# Altium footprint library goldpin_pcb.PcbLib: 235 footprints (part 3 of 15)
Each footprint in its own frame and in the unit in brackets; x right, y up, seen from the top. Pads: shape width x height; smd on the part's side, far side on the other; paste and mask are expansions set on the pad; w line width, h text height; cw(c..) or ccw(c..) is an arc to the next point about the centre after c.
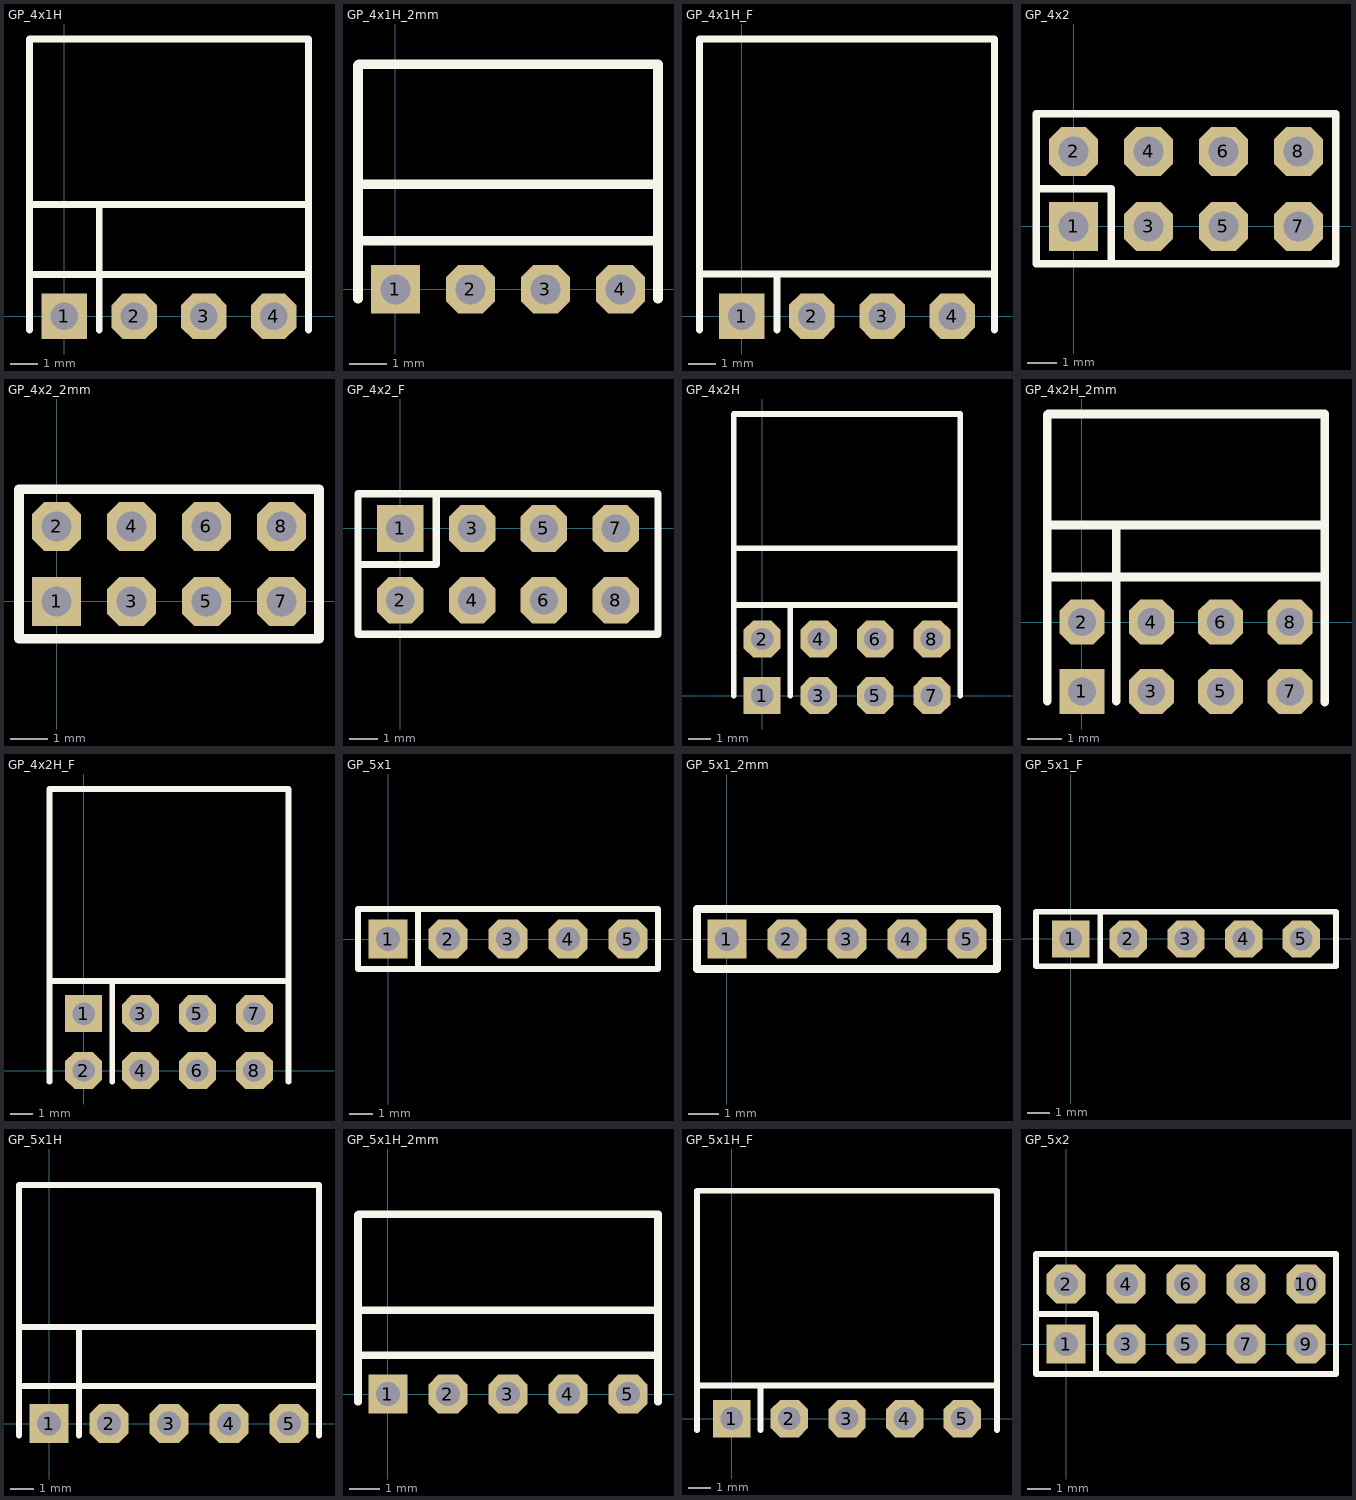
[diagram p2: the footprints below, top view; thin cyan lines are the x and y axes]

## GP_4x1H [mil]
pads (4):
  rect 65x65 hole 39.37: 1(0,0)
  oct 65x65 hole 39.37: 2(100,0) 3(200,0) 4(300,0)
Top Overlay:
  lines w10: -50,-19.68 -50,80.31 -50,397.64 350,397.64 350,80.31 350,-19.68 ; -50,60 350,60 350,71.26 ; -50,160.51 350,160.51 ; 50,-19.68 50,80.31 50,160
3D body: height 120.87, standoff -89.13, extent -50,-12.5 350,390

## GP_4x1H_2mm [mm]
height 4.45
pads (4):
  rect 1.3x1.3 hole 0.8: 1(0,0)
  oct 1.3x1.3 hole 0.8: 2(2,0) 3(4,0) 4(6,0)
Top Overlay:
  lines w0.254: -1,-0.25 -1,1.822 -1,5.973 ; -1,1.3 7,1.3 ; -1,2.8 7,2.8
  lines w0.256: -1,5.973 -0.973,6 7,6 7,-0.25
3D body: height 1.99, standoff -3.04, extent -1,-0.25 7,5.973

## GP_4x1H_F [mil]
pads (4):
  rect 65x65 hole 39.37: 1(0,0)
  oct 65x65 hole 39.37: 2(100,0) 3(200,0) 4(300,0)
Top Overlay:
  lines w10: -60,-20 -60,395 360,395 360,-20 ; -55,60 360,60 ; 50,-19.68 50,60
3D body: height 96.71, standoff -98.29, extent -60,-10 360,393

## GP_4x2 [mil]
pads (8):
  rect 65x65 hole 39.37: 1(0,0)
  oct 65x65 hole 39.37: 2(0,100) 3(100,0) 4(100,100) 5(200,0) 6(200,100) 7(300,0) 8(300,100)
Top Overlay:
  lines w10: -50,50 50,50 50,-50 ; -50,-50 -50,150 350,150 350,-50 -50,-50
3D body: height 330, standoff -115, extent -50,-50 350,150

## GP_4x2_2mm [mm]
height 4.45
pads (8):
  rect 1.3x1.3 hole 0.8: 1(0,0)
  oct 1.3x1.3 hole 0.8: 2(0,2) 3(2,0) 4(2,2) 5(4,0) 6(4,2) 7(6,0) 8(6,2)
Top Overlay:
  lines w0.254: -1,-1 -1,2.999 7,2.999 7,-1 -1,-1
3D body: height 6.51, standoff -1.69, extent -1,-0.968 7,2.969

## GP_4x2_F [mil]
pads (8):
  rect 65x65 hole 39.37: 1(0,0)
  oct 65x65 hole 39.37: 2(0,-100) 3(100,0) 4(100,-100) 5(200,0) 6(200,-100) 7(300,0) 8(300,-100)
Top Overlay:
  lines w10: -59.06,-50 50,-50 50,48.45 ; -59.06,-147.49 359.06,-147.49 359.06,48.45 -59.06,48.45 -59.06,-147.49
3D body: height 335, standoff -104, extent -60,-147.49 360,47.51

## GP_4x2H [mil]
pads (8):
  rect 65x65 hole 39.37: 1(0,0)
  oct 65x65 hole 39.37: 2(0,100) 3(100,0) 4(100,100) 5(200,0) 6(200,100) 7(300,0) 8(300,100)
Top Overlay:
  lines w10: -50,0 -50,180.31 -50,497.64 350,497.64 350,180.31 350,0 ; -50,160 350,160 350,171.26 ; -50,260.51 350,260.51 ; 50,0 50,160
3D body: height 220.08, standoff -89.92, extent -50,-12.5 350,490

## GP_4x2H_2mm [mm]
height 4.45
pads (8):
  rect 1.3x1.3 hole 0.8: 1(0,-2)
  oct 1.3x1.3 hole 0.8: 2(0,0) 3(2,-2) 4(2,0) 5(4,-2) 6(4,0) 7(6,-2) 8(6,0)
Top Overlay:
  lines w0.254: -1,-2.275 -1,1.822 -1,5.973 ; -1,1.3 6.994,1.3 ; -1,2.8 6.996,2.8 ; 0.99,-2.275 0.99,2.775 ; 7,-2.3 7,6
  lines w0.256: -1,5.973 -0.973,6 7,6
3D body: height 3.97, standoff -3.02, extent -1.025,-2.261 6.975,5.961

## GP_4x2H_F [mil]
pads (8):
  rect 65x65 hole 39.37: 1(0,100)
  oct 65x65 hole 39.37: 2(0,0) 3(100,100) 4(100,0) 5(200,100) 6(200,0) 7(300,100) 8(300,0)
Top Overlay:
  lines w10: -60,-20 -60,495 360,495 360,-20 ; -60,157.24 358.27,157.24 ; 50,-20 50,157.24
3D body: height 197.89, standoff -97.11, extent -60,-10 360,493

## GP_5x1 [mil]
pads (5):
  rect 65x65 hole 39.37: 1(0,0)
  oct 65x65 hole 39.37: 2(100,0) 3(200,0) 4(300,0) 5(400,0)
Top Overlay:
  lines w10: 50,-50 50,50 ; -50,-50 -50,50 450,50 450,-50 -50,-50
3D body: height 330, standoff -115, extent -50,-50 450,50

## GP_5x1_2mm [mm]
height 4.45
pads (5):
  rect 1.3x1.3 hole 0.8: 1(0,0)
  oct 1.3x1.3 hole 0.8: 2(2,0) 3(4,0) 4(6,0) 5(8,0)
Top Overlay:
  lines w0.254: -1,-1 -1,1 9,1 9,-1 -1,-1
3D body: height 5.51, standoff -2.69, extent -1,-0.99 9,0.991

## GP_5x1_F [mil]
pads (5):
  rect 65x65 hole 39.37: 1(0,0)
  oct 65x65 hole 39.37: 2(100,0) 3(200,0) 4(300,0) 5(400,0)
Top Overlay:
  lines w10: 51.18,-47.24 51.18,47.24 ; -60,-47.24 -60,47.24 460,47.24 460,-47.24 -60,-47.24
3D body: height 335, standoff -104, extent -60,-47.5 460,47.51

## GP_5x1H [mil]
pads (5):
  rect 65x65 hole 39.37: 1(0,0)
  oct 65x65 hole 39.37: 2(100,0) 3(200,0) 4(300,0) 5(400,0)
Top Overlay:
  lines w10: -50,-19.68 -50,80.31 -50,397.64 450,397.64 450,180.31 450,-19.68 ; -50,62.24 450,62.24 ; -50,160.51 450,160.51 ; 50,-19.68 50,80.31 50,160 ; 449.76,47.24 450,47
3D body: height 120, standoff -90, extent -50,-11.25 450,391.25

## GP_5x1H_2mm [mm]
height 4.45
pads (5):
  rect 1.3x1.3 hole 0.8: 1(0,0)
  oct 1.3x1.3 hole 0.8: 2(2,0) 3(4,0) 4(6,0) 5(8,0)
Top Overlay:
  lines w0.254: -1,-0.25 -1,1.822 -1,5.973 ; -1,1.3 9,1.3 ; -1,2.8 9,2.8
  lines w0.256: -1,5.973 -0.973,6 9,6 9,-0.25
3D body: height 1.99, standoff -3.04, extent -1,-0.25 9,5.973

## GP_5x1H_F [mil]
pads (5):
  rect 65x65 hole 39.37: 1(0,0)
  oct 65x65 hole 39.37: 2(100,0) 3(200,0) 4(300,0) 5(400,0)
Top Overlay:
  lines w10: -60,-20 -60,395 460,395 460,-20 ; -60,57.24 460,57.24 ; 50,-19.68 50,57.24
3D body: height 96.71, standoff -98.29, extent -60,-10 460,393

## GP_5x2 [mil]
pads (10):
  rect 65x65 hole 39.37: 1(0,0)
  oct 65x65 hole 39.37: 2(0,100) 3(100,0) 4(100,100) 5(200,0) 6(200,100) 7(300,0) 8(300,100) 9(400,0) 10(400,100)
Top Overlay:
  lines w10: -50,50 50,50 50,-50 ; -50,-50 -50,150 449.76,150 449.76,-49.76 450,-50 -50,-50
3D body: height 330, standoff -115, extent -50,-50 450,150